# Altium integrated library Mastermind Devices.IntLib: 910 symbols (part 5 of 6) (continued)
## TLC5941NT (continued)

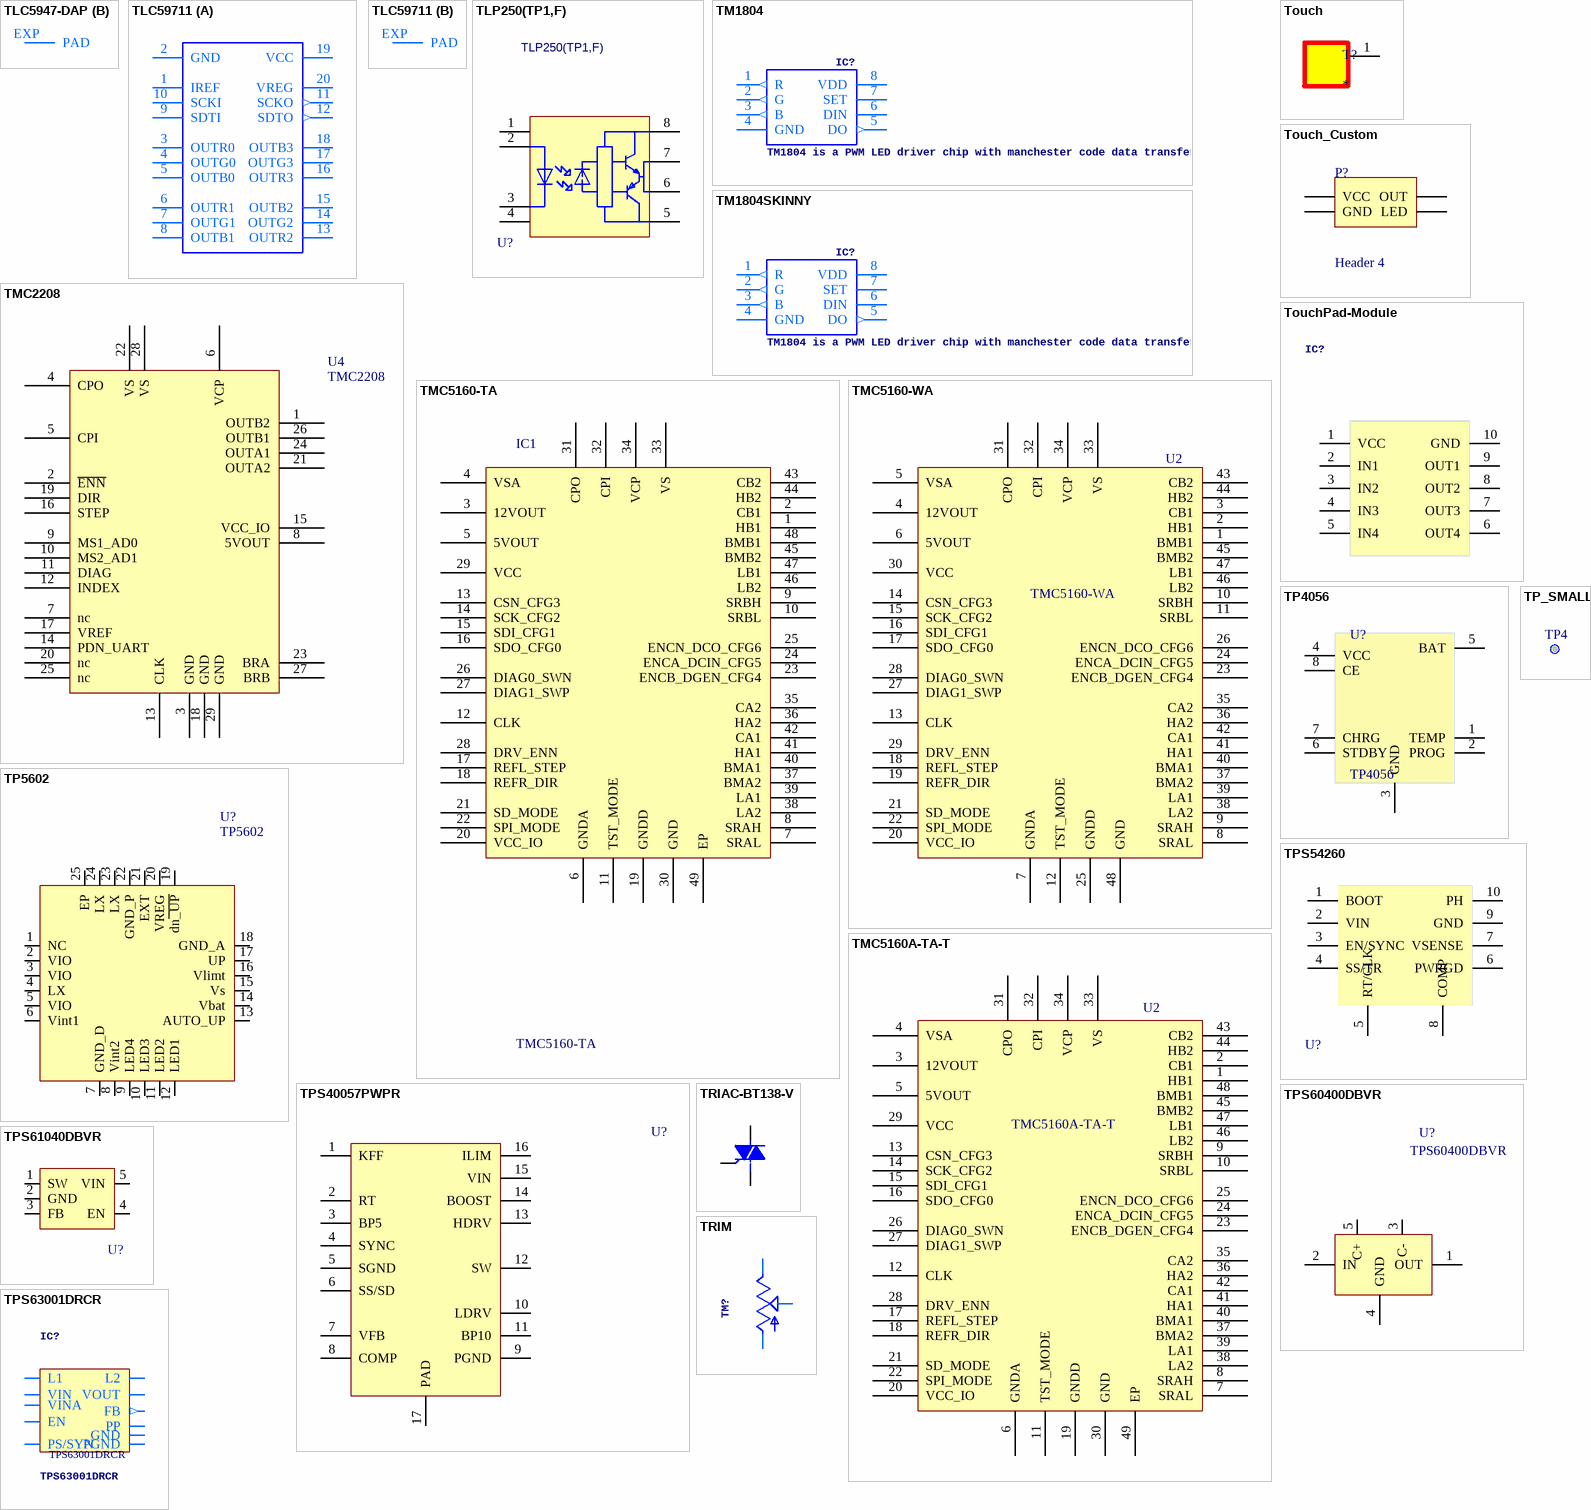
[diagram p35: symbols TLC5947-DAP to TRIM]

## TLC5947-DAP
designator IC?
footprint HTSSOP32DAP
part A pins: 1 GND (power), 2 BLANK, 3 SCLK, 4 SIN, 5 OUT0 (oc), 6 OUT1 (oc), 7 OUT2 (oc), 8 OUT3 (oc), 9 OUT4 (oc), 10 OUT5 (oc), 11 OUT6 (oc), 12 OUT7 (oc), 13 OUT8 (oc), 14 OUT9 (oc), 15 OUT10 (oc), 16 OUT11 (oc), 17 OUT12 (oc), 18 OUT13 (oc), 19 OUT14 (oc), 20 OUT15 (oc), 21 OUT16 (oc), 22 OUT17 (oc), 23 OUT18 (oc), 24 OUT19 (oc), 25 OUT20 (oc), 26 OUT21 (oc), 27 OUT22 (oc), 28 OUT23 (oc), 29 SOUT (out), 30 XLAT, 31 IREF, 32 VCC (power)
part B pins: EXP PAD

## TLC59711
designator IC?
footprint HTSSOP20DAP
part A pins: 1 IREF, 2 GND (power), 3 OUTR0 (oc), 4 OUTG0 (oc), 5 OUTB0 (oc), 6 OUTR1 (oc), 7 OUTG1 (oc), 8 OUTB1 (oc), 9 SDTI, 10 SCKI, 11 SCKO (out), 12 SDTO (out), 13 OUTR2 (oc), 14 OUTG2 (oc), 15 OUTB2 (oc), 16 OUTR3 (oc), 17 OUTG3 (oc), 18 OUTB3 (oc), 19 VCC (power), 20 VREG
part B pins: EXP PAD

## TLP250(TP1,F)
designator U?
Opto Gate Driver; Manufacturer: TOSHIBA; Supplier: LCSC; Manufacturer Part: TLP250(TP1,F); Supplier Part: C41664; spicePre: U; spiceSymbolName: TLP250(TP1,F)
footprint DIL08-ROUND
pins: 1, 2, 3, 4, 5 GND, 6, 7, 8 VCC

## TM1804
designator IC?, comment TM1804 is a PWM LED driver chip with manchester code data transfer!
footprint SO08
pins: 1 R (out), 2 G (out), 3 B (out), 4 GND (power), 5 DO (out), 6 DIN, 7 SET, 8 VDD (power)

## TM1804SKINNY
designator IC?, comment TM1804 is a PWM LED driver chip with manchester code data transfer!
footprint SO08-SKINNYPADS
pins: 1 R (out), 2 G (out), 3 B (out), 4 GND (power), 5 DO (out), 6 DIN, 7 SET, 8 VDD (power)

## TMC2208
designator U4
footprint QFN28
pins: 1 OUTB2, 2 ~{ENN}, 3 GND, 4 CPO, 5 CPI, 6 VCP, 7 nc, 8 5VOUT, 9 MS1_AD0, 10 MS2_AD1, 11 DIAG, 12 INDEX, 13 CLK, 14 PDN_UART, 15 VCC_IO, 16 STEP, 17 VREF, 18 GND, 19 DIR, 20 nc, 21 OUTA2, 22 VS, 23 BRA, 24 OUTA1, 25 nc, 26 OUTB1, 27 BRB, 28 VS, 29 GND

## TMC5160-TA
designator IC1
Manufacturer: TRINAMIC; Geometry.Height: 1,2mm; Distributor#1: Digikey; Distributor#2: *; MPN: TMC5160-TA; MF: TRINAMIC
footprint TMC5160_TSQFP50P900X900X120_HS-49L (TSQFP, 48-Leads, Body 7,00x7,00mm, Pitch 0,50mm, Thermal Pad 5,10x5,10mm, IPC High Density)
pins: 1 HB1, 2 CB1, 3 12VOUT, 4 VSA, 5 5VOUT, 6 GNDA, 7 SRAL, 8 SRAH, 9 SRBH, 10 SRBL, 11 TST_MODE, 12 CLK, 13 CSN_CFG3, 14 SCK_CFG2, 15 SDI_CFG1, 16 SDO_CFG0, 17 REFL_STEP, 18 REFR_DIR, 19 GNDD, 20 VCC_IO, 21 SD_MODE, 22 SPI_MODE, 23 ENCB_DGEN_CFG4, 24 ENCA_DCIN_CFG5, 25 ENCN_DCO_CFG6, 26 DIAG0_SWN, 27 DIAG1_SWP, 28 DRV_ENN, 29 VCC, 30 GND, 31 CPO, 32 CPI, 33 VS, 34 VCP, 35 CA2, 36 HA2, 37 BMA2, 38 LA2, 39 LA1, 40 BMA1, 41 HA1, 42 CA1, 43 CB2, 44 HB2, 45 BMB2, 46 LB2, 47 LB1, 48 BMB1, 49 EP

## TMC5160-WA
designator U2
Designaor: *
footprint QFN-56_L8.0-W8.0-P0.50-BL-EP6.3-TMC5160
pins: 1 BMB1, 2 HB1, 3 CB1, 4 12VOUT, 5 VSA, 6 5VOUT, 7 GNDA, 8 SRAL, 9 SRAH, 10 SRBH, 11 SRBL, 12 TST_MODE, 13 CLK, 14 CSN_CFG3, 15 SCK_CFG2, 16 SDI_CFG1, 17 SDO_CFG0, 18 REFL_STEP, 19 REFR_DIR, 20 VCC_IO, 21 SD_MODE, 22 SPI_MODE, 23 ENCB_DGEN_CFG4, 24 ENCA_DCIN_CFG5, 25 GNDD, 26 ENCN_DCO_CFG6, 27 DIAG1_SWP, 28 DIAG0_SWN, 29 DRV_ENN, 30 VCC, 31 CPO, 32 CPI, 33 VS, 34 VCP, 35 CA2, 36 HA2, 37 BMA2, 38 LA2, 39 LA1, 40 BMA1, 41 HA1, 42 CA1, 43 CB2, 44 HB2, 45 BMB2, 46 LB2, 47 LB1, 48 GND

## TMC5160A-TA-T
designator U2
BOM_Manufacturer: TRINAMIC Motion Control GmbH; Contributor: LCSC; BOM_Supplier: LCSC; BOM_Supplier Part: C516354; BOM_Manufacturer Part: TMC5160A-TA-T; BOM_JLCPCB Part Class: Extended Part; spicePre: U; spiceSymbolName: TMC5160A-TA-T
footprint TQFP-48_L7.0-W7.0-P0.50-LS9.0-BL-EP
pins: 1 HB1, 2 CB1, 3 12VOUT, 4 VSA, 5 5VOUT, 6 GNDA, 7 SRAL, 8 SRAH, 9 SRBH, 10 SRBL, 11 TST_MODE, 12 CLK, 13 CSN_CFG3, 14 SCK_CFG2, 15 SDI_CFG1, 16 SDO_CFG0, 17 REFL_STEP, 18 REFR_DIR, 19 GNDD, 20 VCC_IO, 21 SD_MODE, 22 SPI_MODE, 23 ENCB_DGEN_CFG4, 24 ENCA_DCIN_CFG5, 25 ENCN_DCO_CFG6, 26 DIAG0_SWN, 27 DIAG1_SWP, 28 DRV_ENN, 29 VCC, 30 GND, 31 CPO, 32 CPI, 33 VS, 34 VCP, 35 CA2, 36 HA2, 37 BMA2, 38 LA2, 39 LA1, 40 BMA1, 41 HA1, 42 CA1, 43 CB2, 44 HB2, 45 BMB2, 46 LB2, 47 LB1, 48 BMB1, 49 EP

## Touch
designator T?
footprint Touch
footprint TouchSquare_15mm
footprint Touch - SPRING
footprint TouchSquare_12mm
footprint Touch - Circle
pins: 1 T

## Touch_Custom
designator P?, comment Header 4
Header, 4-Pin; LatestRevisionDate: 17-Jul-2002; LatestRevisionNote: Re-released for DXP Platform.; Publisher: Altium Limited
footprint TOUCH_Custom
pins: 1 GND, 2 OUT, 3 VCC, 4 LED

## TouchPad-Module
designator IC?, comment TIMERChanged DIP package to have round (not oval) pin pads    http://www.ladyada.net/library/pcb/eaglelibrary.html  (value not drawn)
footprint TOUCHMODULE
pins: 1 VCC, 2 IN1, 3 IN2, 4 IN3, 5 IN4, 6 OUT4, 7 OUT3, 8 OUT2, 9 OUT1, 10 GND

## TP4056
designator U?
-40℃~+85℃ 1 1A 3.7V~6.5V 35uA 4.2V Support Support ESOP-8 Battery Management ROHS
footprint SOP-8_L4.9-W3.9-P1.27-LS6.0-BL-EP3.5
pins: 1 TEMP (power), 2 PROG, 3,9 GND, 4 VCC (power), 5 BAT, 6 STDBY, 7 CHRG, 8 CE
text: 3

## TP5602
designator U?
Manufacturer: TOPPOWER(南京拓微); Add into BOM: yes; Symbol: TP5602; Device: TP5602; LCSC Part Name: 停产; Supplier Part: C80366; Manufacturer Part: TP5602; Supplier Footprint: QFN-24-EP(4x4); JLCPCB Part Class: Extended Part; Datasheet: https://atta.szlcsc.com/upload/public/pdf/source/20170322/1490151657420.pdf; Supplier: LCSC; Convert to PCB: yes
footprint QFN-24_L4.0-W4.0-P0.50-TL-EP2.5
3D model QFN-24_L4.0-W4.0-P0.50-TL-EP2.1
pins: 1 NC, 2 VIO, 3 VIO, 4 LX, 5 VIO, 6 Vint1, 7 GND_D, 8 Vint2, 9 LED4, 10 LED3, 11 LED2, 12 LED1, 13 AUTO_UP, 14 Vbat, 15 Vs, 16 Vlimt, 17 UP, 18 GND_A, 19 dn~{_UP}, 20 VREG, 21 EXT, 22 GND_P, 23 LX, 24 LX, 25 EP

## TP_SMALL
designator TP4  (value not drawn)
footprint TP_SMALL
pins: 0

## TPS40057PWPR
designator U?, comment TPS40057  (value not drawn)
Step-down type 8V~40V TSSOP-16-EP DC-DC Converters ROHS; Manufacturer: TI(德州仪器); Symbol: TPS40057PWPR; Add into BOM: yes; Switching Frequency: 1MHz; Number of Outputs: 1; Switch tube (built-in/external): 外置; Device: TPS40057PWPR; LCSC Part Name: TPS40057PWPR; Supplier Part: C27994; Manufacturer Part: TPS40057PWPR; Supplier Footprint: TSSOP-16-EP; JLCPCB Part Class: Extended Part; Datasheet: https://www.ti.com/cn/lit/gpn/tps40057; Supplier: LCSC; Convert to PCB: yes; Function: Step-down type; Input Voltage: 8V~40V; Output Current (Max): -; Operating Temperature: -; Synchronous Rectification: Yes; Topology: Step-down; Quiescent Current (Iq): -
footprint TSSOP-16_L5.0-W4.4-P0.65-LS6.4-BL-EP
pins: 1 KFF, 2 RT, 3 BP5, 4 SYNC, 5 SGND, 6 SS/SD, 7 VFB, 8 COMP, 9 PGND, 10 LDRV, 11 BP10, 12 SW, 13 HDRV, 14 BOOST, 15 VIN, 16 ILIM, 17 PAD

## TPS54260
designator U?
footprint HVSSOP10
pins: 1 BOOT, 2 VIN, 3 EN/SYNC, 4 SS/TR, 5 RT/CLK, 6 PWRGD, 7 VSENSE (power), 8 COMP, 9 GND (power), 10 PH

## TPS60400DBVR
designator U?
Manufacturer: TI(德州仪器); Add into BOM: yes; Symbol: TPS60400DBVR; Device: TPS60400DBVR; LCSC Part Name: TPS60400DBVR; Supplier Part: C9839; Manufacturer Part: TPS60400DBVR; Supplier Footprint: SOT-23-5; JLCPCB Part Class: Extended Part; Datasheet: https://www.ti.com/cn/lit/gpn/tps60400; Supplier: LCSC; Convert to PCB: yes
3D model SOT-23-5_L2.9-W1.6-H1.1-LS2.8-P0.95
footprint SOT23-5L
pins: 1 OUT, 2 IN, 3 C-, 4 GND, 5 C+

## TPS61040DBVR
designator U?  (value not drawn)
Boost type 28V 1.8V~6V 350mA SOT-23-5 DC-DC Converters ROHS; Manufacturer: TI(德州仪器); Add into BOM: yes; Function: boost converterType; Switching Frequency: 1MHz; Synchronous Rectification: NO; Number of Outputs: 1; Switch tube (built-in/external): 内置; Symbol: TPS61040DBVR; Device: TPS61040DBVR; LCSC Part Name: TPS61040DBVR; Supplier Part: C7722; Manufacturer Part: TPS61040DBVR; Supplier Footprint: SOT-23-5; JLCPCB Part Class: Extended Part; Datasheet: https://www.ti.com/cn/lit/gpn/tps61040; Supplier: LCSC; Convert to PCB: yes; Input Voltage: 1.8V~6V; Output Voltage: 28V; Output Current (Max): 350mA; Topology: Boost
3D model SOT-23-5_L2.9-W1.6-H1.1-LS2.8-P0.95
footprint SOT23-5L
pins: 1 SW, 2 GND, 3 FB, 4 EN, 5 VIN

## TPS63001DRCR
designator IC?
footprint TPS63001DRCR
pins: 1 VOUT, 2 L2, 3 PGND, 4 L1, 5 VIN, 6 EN, 7 PS/SYN, 8 VINA, 9 GND, 10 FB (out), 11 PP

## TRIAC-BT138-V
designator BT1, comment TRIAC   Source: http://www.semiconductors.philips.com BT138_SERIES_2.pdf  (value not drawn)
footprint TO220DS
pins: G, T1 A1, T2 A2

## TRIM
designator TM?
footprint 6MM
pins: A, E, S

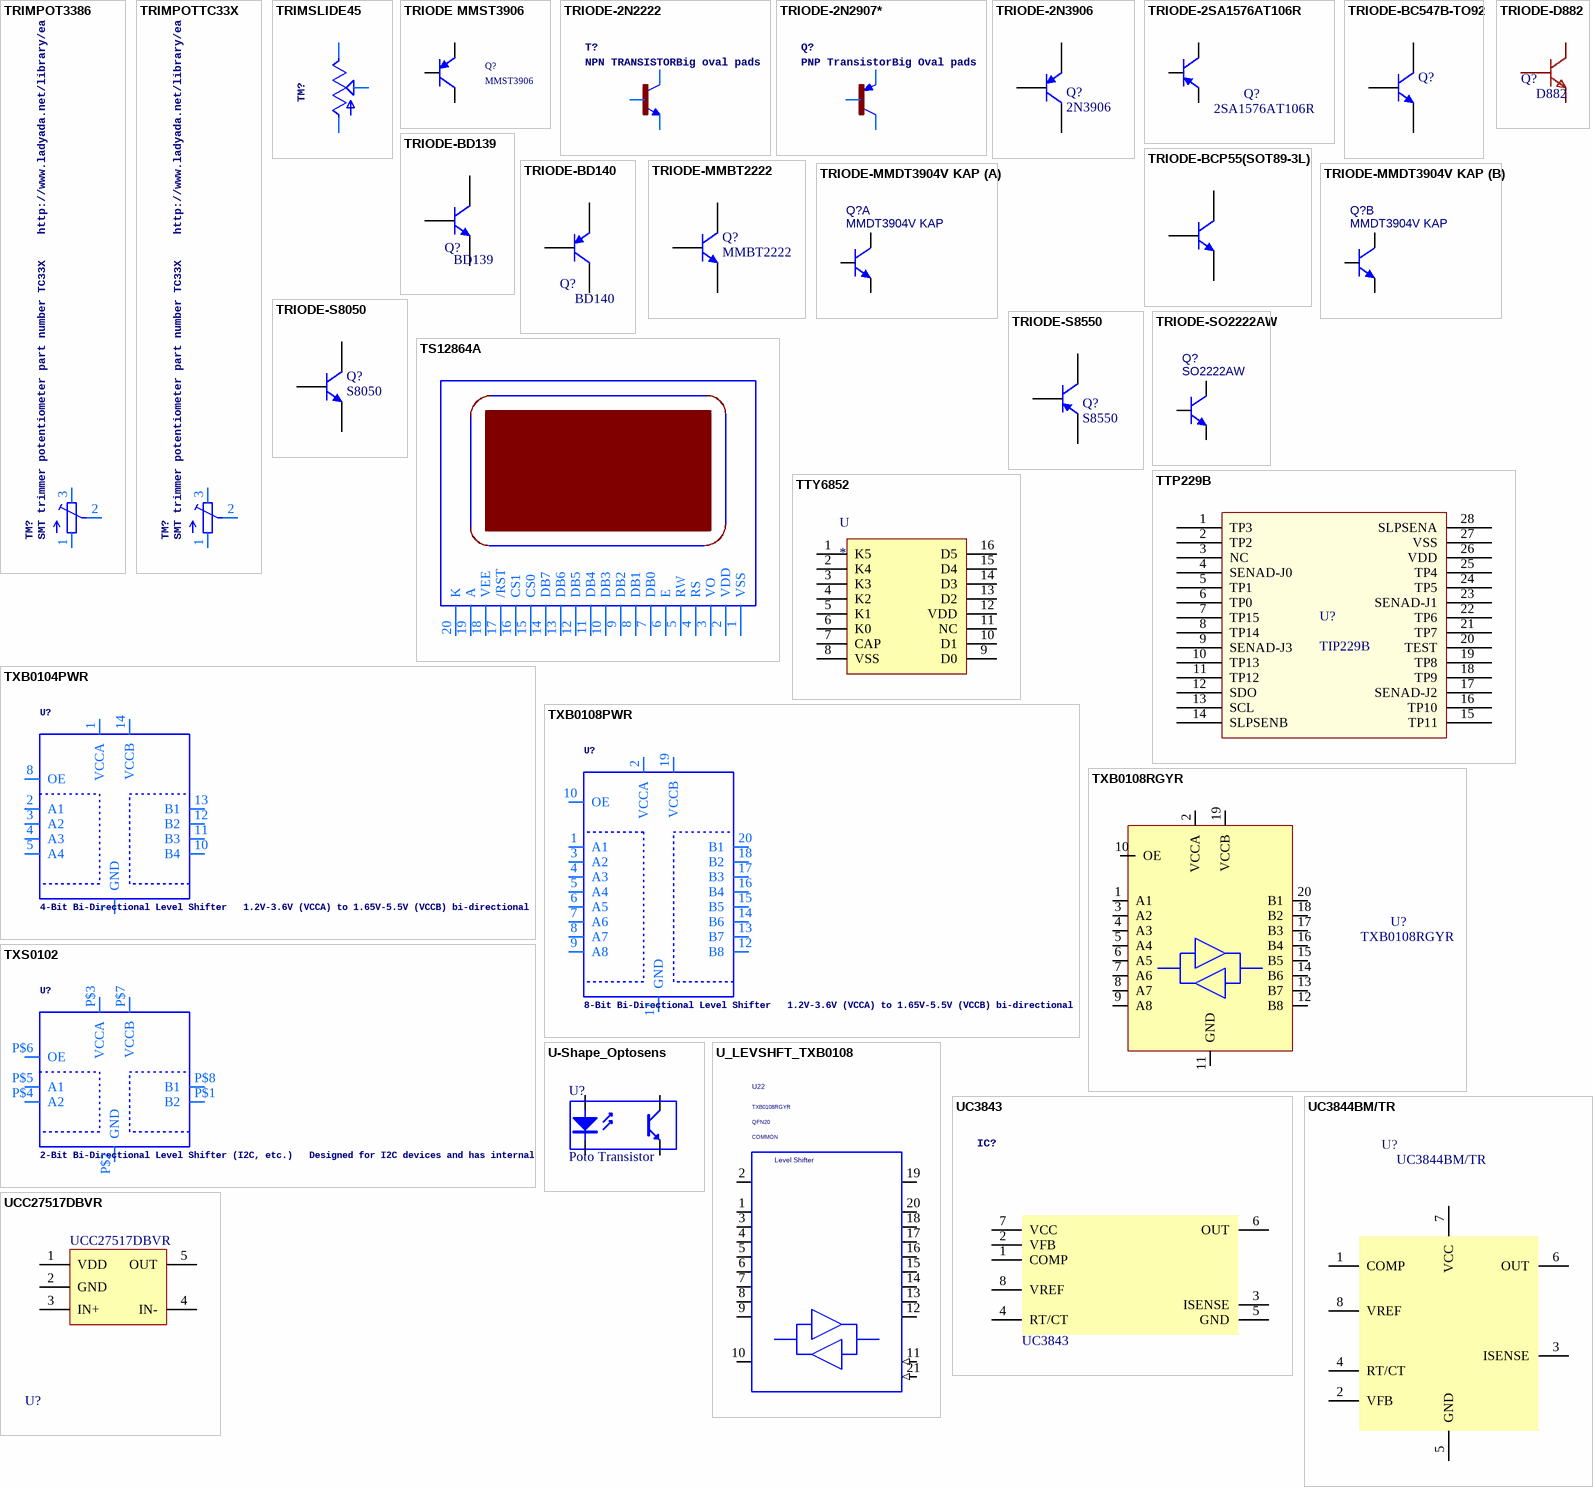
[diagram p36: symbols TRIMPOT3386 to UCC27517DBVR]

## TRIMPOT3386
designator TM?, comment SMT trimmer potentiometer part number TC33X    http://www.ladyada.net/library/eagle
footprint TRIM-3386
pins: 1 A, 2 S, 3 E

## TRIMPOTTC33X
designator TM?, comment SMT trimmer potentiometer part number TC33X    http://www.ladyada.net/library/eagle
footprint TC33X
pins: 1 A, 2 S, 3 E

## TRIMSLIDE45
designator TM?
footprint SLIDEPOT-45
pins: A, B S, C E

## TRIODE MMST3906
designator Q?, comment MMST3906
40V 200mW 100@10mA,1V 200mA PNP SOT-323 Bipolar (BJT) ROHS; Manufacturer: BORN(伯恩半导体); Symbol: MMST3906_C6165146; Add into BOM: yes; Transition Frequency (fT): 250MHz; Collector Cut-Off Current (Icbo): 100nA; Collector-Emitter Saturation Voltage (VCE(sat)@Ic,Ib): 300mV@50mA,5mA; Device: MMST3906_C6165146; LCSC Part Name: PNP 电流:200mA 耐压:40V; Supplier Part: C6165146; Manufacturer Part: MMST3906; Supplier Footprint: SOT-323; JLCPCB Part Class: Extended Part; Datasheet: https://atta.szlcsc.com/upload/public/pdf/source/20230523/835E4C8E85552AA52B7D0E8CCD67386F.pdf; Supplier: LCSC; Convert to PCB: yes; Collector Current (Ic): 200mA; Collector-Emitter Breakdown Voltage (Vceo): 40V; DC Current Gain (hFE@Ic,Vce): 100@10mA,1V; Operating Temperature: -55℃~+150℃
footprint SOT-323-3_L2.1-W1.3-P1.30-LS2.3-BR
pins: 1 B, 2 E, 3 C

## TRIODE-2N2222
designator T?, comment NPN TRANSISTORBig oval pads
footprint TO92-EBC-OVAL
pins: 1 E, 2 B, 3 C

## TRIODE-2N2907*
designator Q?, comment PNP TransistorBig Oval pads
footprint TO92-EBC-OVAL
pins: 1 E, 2 B, 3 C

## TRIODE-2N3906
designator Q?, comment 2N3906
PNP General Purpose Amplifier; Published: 8-Jun-2000; LatestRevisionDate: 15-Jan-2003; LatestRevisionNote: PCB Footprint 'BCY-W3/D4.7' replaced; DatasheetVersion: 1997; PackageVersion: Sep-1998; PackageReference: TO-92A; Publisher: Altium Limited; PackageDescription: TO, Flat Index; 3 In-Line, Axial Leads; Body Dia. 4.5mm; Leads 0.51 x 0.48 mm (max); ComponentLink1Description: Manufacturer Link; ComponentLink1URL: http://www.fairchildsemi.com/; ComponentLink2Description: Datasheet; ComponentLink2URL: http://www.fairchildsemi.com/ds/2N%2F2N3906.pdf
simulation model 2N3906 (PNP)
signal-integrity model 2N3906
footprint SOT23
pins: 1 B, 2 E, 3 C

## TRIODE-2SA1576AT106R
designator Q?, comment 2SA1576AT106R
50V 200mW 120@1mA,6V 150mA PNP SOT-323 Bipolar (BJT) ROHS; Manufacturer: ROHM(罗姆); Add into BOM: yes; Transition Frequency (fT): 140MHz; Collector Cut-Off Current (Icbo): 100nA; Collector-Emitter Saturation Voltage (VCE(sat)@Ic,Ib): 500mV@50mA,5mA; Symbol: 2SA1576AT106R; Device: 2SA1576AT106R; LCSC Part Name: PNP 电流:150mA 耐压:50V; Supplier Part: C111698; Manufacturer Part: 2SA1576AT106R; Supplier Footprint: SOT-323; JLCPCB Part Class: Extended Part; Datasheet: https://atta.szlcsc.com/upload/public/pdf/source/20170510/1494399710486.pdf; Supplier: LCSC; Convert to PCB: yes; DC Current Gain (hFE@Ic,Vce): 120@1mA,6V; Operating Temperature: -55℃~+150℃
footprint SOT-323-3_L2.1-W1.3-P1.30-LS2.3-BR
pins: 1, 2, 3

## TRIODE-BC547B-TO92
designator Q?
NPN Bipolar Transistor TO92; Published: 8-Jun-2000; LatestRevisionDate: 17-Jul-2002; LatestRevisionNote: Re-released for DXP Platform.; PackageReference: TO-226-AA; Publisher: Altium Limited; PackageDescription: TO, Flat Index; 3 In-Line, Axial Leads; Body Dia. 4.8mm; Leads 0.55 x 0.51 mm (max); Code_JEDEC: TO-226-AA
simulation model NPN
signal-integrity model NPN
footprint TO92-INLINE
pins: 1 C, 2 B, 3 E

## TRIODE-BCP55(SOT89-3L)
designator T?, comment BCP55(SOT89-3L)  (value not drawn)
60V 1.5A Transistor; Manufacturer: HXY MOSFET(华轩阳电子); Add into BOM: yes; DC Current Gain (hFE@Ic,Vce): 250@150mA,2V; Transition Frequency (fT): 100MHz; Collector Cut-Off Current (Icbo): 100nA; Collector-Emitter Saturation Voltage (VCE(sat)@Ic,Ib): 500mV@500mA,50mA; Symbol: BCP55(SOT89-3L); Device: BCP55(SOT89-3L); LCSC Part Name: 耐压:60V 电流:1A NPN; Supplier Part: C5346132; Manufacturer Part: BCP55(SOT89-3L); Supplier Footprint: SOT-89-3L; JLCPCB Part Class: Extended Part; Datasheet: https://atta.szlcsc.com/upload/public/pdf/source/20230112/7861CB78B5C82510FD37DBAFC3054306.pdf; Supplier: LCSC; Convert to PCB: yes; Operating Temperature: -55℃~+150℃
footprint SOT89-3
pins: 1 B, 2 C, 3 E

## TRIODE-BD139
designator Q?, comment BD139
Manufacturer: ST(意法半导体); Add into BOM: yes; type: NPN; Current - Collector(Ic): 1.5A; Collector - Emitter Voltage VCEO: 80V; Pd - Power Dissipation: 12.5W; DC Current Gain: 63@150mA,2V; Current - Collector Cutoff: 10uA; Vce Saturation(VCE(sat)): 500mV@0.5A,0.05A; Emitter-Base Voltage(Vebo): 5V; Number: 1 NPN; Symbol: BD139; Device: BD139; LCSC Part Name: NPN 电流:1.5A 电压:80V; Supplier Part: C27866; Manufacturer Part: BD139; Supplier Footprint: TO-126; JLCPCB Part Class: Extended Part; Datasheet: https://item.szlcsc.com/datasheet/BD139/28616.html; Supplier: LCSC; Convert to PCB: yes; Operating Temperature: -65℃~+150℃
footprint TO-126_L7.5-W2.5-P2.3-B
3D model TO-126_L7.5-W2.5-H10.8-P2.29
pins: 1 B, 2 C, 3 E

## TRIODE-BD140
designator Q?, comment BD140
Manufacturer: CJ(江苏长电/长晶); Symbol: BD140_C20604; Add into BOM: yes; type: PNP; Current - Collector(Ic): 1.5A; Collector - Emitter Voltage VCEO: 80V; Pd - Power Dissipation: 1.25W; DC Current Gain: 40@150mA,2V; Current - Collector Cutoff: 100nA; Vce Saturation(VCE(sat)): 500mV@500mA,50mA; Emitter-Base Voltage(Vebo): 5V; Number: 1 PNP; Device: BD140; LCSC Part Name: PNP 电流:1.5A 电压:80V; Supplier Part: C20604; Manufacturer Part: BD140; Supplier Footprint: TO-126; JLCPCB Part Class: Extended Part; Datasheet: https://item.szlcsc.com/datasheet/BD140/21316.html; Supplier: LCSC; Convert to PCB: yes; Transition frequency(fT): -; Operating Temperature: -55℃~+150℃
footprint TO-126_L8.3-W3.5-P2.29-T
3D model TO-126_L8.0-W3.3-H11.0-P2.29
pins: 1 E, 2 C, 3 B

## TRIODE-D882
designator Q?, comment D882
10W 30V 3A NPN SOT-89 Single Bipolar Transistors RoHS; Manufacturer: GOODWORK(固得沃克); Symbol: D882_C22470935; Add into BOM: yes; DC Current Gain: 400@20mA,2V; Transition frequency(fT): 90MHz; Current - Collector Cutoff: 1uA; Vce Saturation(VCE(sat)): 500mV@2A,0.2A; Emitter-Base Voltage(Vebo): 5V; Device: D882_C22470935; LCSC Part Name: NPN 电流:3A 耐压:30V; Supplier Part: C22470935; Manufacturer Part: D882; Supplier Footprint: SOT-89; JLCPCB Part Class: Extended Part; Datasheet: https://item.szlcsc.com/datasheet/D882/24189372.html; Supplier: LCSC; Convert to PCB: yes; type: NPN; Current - Collector(Ic): 3A; Collector - Emitter Voltage VCEO: 30V; Pd - Power Dissipation: 10W; Operating Temperature: -55℃~+150℃@(Tj)
footprint SOT-89-3_L4.5-W2.5-P1.50-LS4.2-BR
3D model SOT-89-3_L4.3-W2.5-H1.6-LS4.1-P1.50
pins: 1 B, 2 C, 3 E

## TRIODE-MMBT2222
designator Q?, comment MMBT2222
NPN SOT-23 Bipolar (BJT) ROHS; Published: 8-Jun-2000; LatestRevisionDate: 17-Jul-2002; LatestRevisionNote: Re-released for DXP Platform.; PackageReference: TO-226-AA; Publisher: Altium Limited; PackageDescription: TO, Flat Index; 3 In-Line, Axial Leads; Body Dia. 4.8mm; Leads 0.55 x 0.51 mm (max); Code_JEDEC: TO-226-AA
simulation model NPN
signal-integrity model NPN
footprint SOT23
pins: 1 B, 2 E, 3 C

## TRIODE-MMDT3904V KAP
designator Q?, comment MMDT3904V KAP
2 NPN SOT-563 Bipolar Transistors; Manufacturer: CBI(创基); Contributor: LCSC; Supplier: LCSC; Supplier Part: C2919809; Manufacturer Part: MMDT3904V KAP; JLCPCB Part Class: Extended Part; spicePre: Q; spiceSymbolName: MMDT3904V KAP
footprint SOT-563_L1.6-W1.2-P0.50-LS1.6-BR
part A pins: 1 E, 2 B, 6 C
part B pins: 3 C, 4 E, 5 B

## TRIODE-S8050
designator Q?, comment S8050
NPN SOT-23 Bipolar (BJT) ROHS; Published: 8-Jun-2000; LatestRevisionDate: 17-Jul-2002; LatestRevisionNote: Re-released for DXP Platform.; PackageReference: TO-226-AA; Publisher: Altium Limited; PackageDescription: TO, Flat Index; 3 In-Line, Axial Leads; Body Dia. 4.8mm; Leads 0.55 x 0.51 mm (max); Code_JEDEC: TO-226-AA
simulation model NPN
signal-integrity model NPN
footprint SOT23
pins: 1 B, 2 E, 3 C

## TRIODE-S8550
designator Q?, comment S8550
PNP SOT-23 Bipolar (BJT) ROHS; Published: 8-Jun-2000; LatestRevisionDate: 15-Jan-2003; LatestRevisionNote: PCB Footprint 'BCY-W3/D4.7' replaced; DatasheetVersion: 1997; PackageVersion: Sep-1998; PackageReference: TO-92A; Publisher: Altium Limited; PackageDescription: TO, Flat Index; 3 In-Line, Axial Leads; Body Dia. 4.5mm; Leads 0.51 x 0.48 mm (max); ComponentLink1Description: Manufacturer Link; ComponentLink1URL: http://www.fairchildsemi.com/; ComponentLink2Description: Datasheet; ComponentLink2URL: http://www.fairchildsemi.com/ds/2N%2F2N3906.pdf
simulation model 2N3906 (PNP)
signal-integrity model 2N3906
footprint SOT23
pins: 1 B, 2 E, 3 C

## TRIODE-SO2222AW
designator Q?, comment SO2222AW
NPN SOT-323 Bipolar Transistors; Manufacturer: CBI(创基); Manufacturer Part: MMDT3904V KAP; Contributor: LCSC; Supplier: LCSC; Supplier Part: C2919809; JLCPCB Part Class: Extended Part; spicePre: Q; spiceSymbolName: MMDT3904V KAP
footprint SOT-323-3_L2.1-W1.3-P1.30-LS2.3-BR
pins: 1 B, 2 E, 3 C

## TS12864A
designator ?, comment KS0108 based display. Some have slightly different pinouts so double check!  (value not drawn)
footprint TS12864
pins: 1 VSS (oe), 2 VDD (oe), 3 VO, 4 RS, 5 RW, 6 E, 7 DB0, 8 DB1, 9 DB2, 10 DB3, 11 DB4, 12 DB5, 13 DB6, 14 DB7, 15 CS0, 16 CS1, 17 /RST, 18 VEE (oe), 19 A (oe), 20 K

## TTP229B
designator U?, comment TIP229B
TIP229B_28_ic
footprint ttp229
pins: 1 TP3, 2 TP2, 3 NC, 4 SENAD-J0, 5 TP1, 6 TP0, 7 TP15, 8 TP14, 9 SENAD-J3, 10 TP13, 11 TP12, 12 SDO, 13 SCL, 14 SLPSENB, 15 TP11, 16 TP10, 17 SENAD-J2, 18 TP9, 19 TP8, 20 TEST, 21 TP7, 22 TP6, 23 SENAD-J1, 24 TP5, 25 TP4, 26 VDD, 27 VSS, 28 SLPSENA

## TTY6852
designator U
SOP-16_L10.0-W3.9-P1.27-LS6.0-BL; MF: Vishay Semiconductor; MP: TCMT4606; Digi-Key_Part_Number: TCMT4606CT-ND; DigiKey-Purchase-URL: https://snapeda.com/shop?store=DigiKey&id=649284; Package: SOP-16 Vishay; Value: *; SnapEDA_Link: https://www.snapeda.com/parts/TCMT4606/Vishay%20Semiconductor%20Opto%20Division/view-part/649284/?ref=snap
footprint SO-16
pins: 1 K5, 2 K4, 3 K3, 4 K2, 5 K1, 6 K0, 7 CAP, 8 VSS, 9 D0, 10 D1, 11 NC, 12 VDD, 13 D2, 14 D3, 15 D4, 16 D5

## TXB0104PWR
designator U?, comment 4-Bit Bi-Directional Level Shifter   1.2V-3.6V (VCCA) to 1.65V-5.5V (VCCB) bi-directional level shifter with auto direction sensing.    Max data rate - VCCA 1.8V:  20Mbps (50ns), VCCA 3.3V: 100Mbps (10ns)       Digikey: 296-21929-1-ND
footprint TSSOP14
pins: 1 VCCA, 2 A1, 3 A2, 4 A3, 5 A4, 7 GND, 8 OE, 10 B4, 11 B3, 12 B2, 13 B1, 14 VCCB